# Altium schematic symbol library jlcpcb_2025_04_capacitors_extended_0402.schlib: 3594 symbols (part 18 of 20) (continued)
## RF15N1R5A500CT
designator C?  Capacitance: 1.5pF  (hidden comment: *)
Capacitor, Ceramic (MLCC), 1.5pF, 50V, NP0, SMD 0402; Manufacturer: Walsin Tech Corp; Manufacturer Part Number: RF15N1R5A500CT; Package Size: 0402; JLCPCB Basic Part: No; JLCPCB Part Number: C172850; Supplier 1: LCSC; Category: Capacitors - MLCC; Supplier Part Number 1: C172850; Voltage Rating: 50V; Temperature Coefficient: NP0; RoHS: Yes; ComponentLink1Description: Datasheet; ComponentLink1URL: https://wmsc.lcsc.com/wmsc/upload/file/pdf/v2/lcsc/2304140030_Walsin-Tech-Corp-RF15N1R5A500CT_C172850.pdf; ComponentLink2Description: JLCPCB Part URL; ComponentLink2URL: https://jlcpcb.com/partdetail/C172850; ComponentLink3Description: LCSC Part URL; ComponentLink3URL: https://lcsc.com/product-detail/Multilayer-Ceramic-Capacitors-MLCC---SMD-SMT_Walsin-Tech-Corp-Walsin-Tech-Corp-RF15N1R5A500CT_C172850.html
footprint CAP-0402 (0402 (1005M) Capacitor)
pins: 1, 2

## RF15N1R5B500CT
designator C?  Capacitance: 1.5pF  (hidden comment: *)
Capacitor, Ceramic (MLCC), 1.5pF, 50V, NP0, SMD 0402; Manufacturer: Walsin Tech Corp; Manufacturer Part Number: RF15N1R5B500CT; Package Size: 0402; JLCPCB Basic Part: No; JLCPCB Part Number: C338137; Supplier 1: LCSC; Category: Capacitors - MLCC; Supplier Part Number 1: C338137; Voltage Rating: 50V; Temperature Coefficient: NP0; RoHS: Yes; ComponentLink1Description: Datasheet; ComponentLink1URL: https://wmsc.lcsc.com/wmsc/upload/file/pdf/v2/lcsc/2304140030_Walsin-Tech-Corp-RF15N1R5B500CT_C338137.pdf; ComponentLink2Description: JLCPCB Part URL; ComponentLink2URL: https://jlcpcb.com/partdetail/C338137; ComponentLink3Description: LCSC Part URL; ComponentLink3URL: https://lcsc.com/product-detail/Multilayer-Ceramic-Capacitors-MLCC---SMD-SMT_Walsin-Tech-Corp-Walsin-Tech-Corp-RF15N1R5B500CT_C338137.html
footprint CAP-0402 (0402 (1005M) Capacitor)
pins: 1, 2

## RF15N1R6B500CT
designator C?  Capacitance: 1.6pF  (hidden comment: *)
Capacitor, Ceramic (MLCC), 1.6pF, 50V, NP0, SMD 0402; Manufacturer: Walsin Tech Corp; Manufacturer Part Number: RF15N1R6B500CT; Package Size: 0402; JLCPCB Basic Part: No; JLCPCB Part Number: C384678; Supplier 1: LCSC; Category: Capacitors - MLCC; Supplier Part Number 1: C384678; Voltage Rating: 50V; Temperature Coefficient: NP0; RoHS: Yes; ComponentLink1Description: Datasheet; ComponentLink1URL: https://wmsc.lcsc.com/wmsc/upload/file/pdf/v2/lcsc/2304140030_Walsin-Tech-Corp-RF15N1R6B500CT_C384678.pdf; ComponentLink2Description: JLCPCB Part URL; ComponentLink2URL: https://jlcpcb.com/partdetail/C384678; ComponentLink3Description: LCSC Part URL; ComponentLink3URL: https://lcsc.com/product-detail/Multilayer-Ceramic-Capacitors-MLCC---SMD-SMT_Walsin-Tech-Corp-Walsin-Tech-Corp-RF15N1R6B500CT_C384678.html
footprint CAP-0402 (0402 (1005M) Capacitor)
pins: 1, 2

## RF15N1R8A500CT
designator C?  Capacitance: 1.8pF  (hidden comment: *)
Capacitor, Ceramic (MLCC), 1.8pF, 50V, NP0, SMD 0402; Manufacturer: Walsin Tech Corp; Manufacturer Part Number: RF15N1R8A500CT; Package Size: 0402; JLCPCB Basic Part: No; JLCPCB Part Number: C172859; Supplier 1: LCSC; Category: Capacitors - MLCC; Supplier Part Number 1: C172859; Voltage Rating: 50V; Temperature Coefficient: NP0; RoHS: Yes; ComponentLink1Description: Datasheet; ComponentLink1URL: https://wmsc.lcsc.com/wmsc/upload/file/pdf/v2/lcsc/2304140030_Walsin-Tech-Corp-RF15N1R8A500CT_C172859.pdf; ComponentLink2Description: JLCPCB Part URL; ComponentLink2URL: https://jlcpcb.com/partdetail/C172859; ComponentLink3Description: LCSC Part URL; ComponentLink3URL: https://lcsc.com/product-detail/Multilayer-Ceramic-Capacitors-MLCC---SMD-SMT_Walsin-Tech-Corp-Walsin-Tech-Corp-RF15N1R8A500CT_C172859.html
footprint CAP-0402 (0402 (1005M) Capacitor)
pins: 1, 2

## RF15N1R8B500CT
designator C?  Capacitance: 1.8pF  (hidden comment: *)
Capacitor, Ceramic (MLCC), 1.8pF, 50V, NP0, SMD 0402; Manufacturer: Walsin Tech Corp; Manufacturer Part Number: RF15N1R8B500CT; Package Size: 0402; JLCPCB Basic Part: No; JLCPCB Part Number: C396875; Supplier 1: LCSC; Category: Capacitors - MLCC; Supplier Part Number 1: C396875; Voltage Rating: 50V; Temperature Coefficient: NP0; RoHS: Yes; ComponentLink1Description: Datasheet; ComponentLink1URL: https://wmsc.lcsc.com/wmsc/upload/file/pdf/v2/lcsc/2304140030_Walsin-Tech-Corp-RF15N1R8B500CT_C396875.pdf; ComponentLink2Description: JLCPCB Part URL; ComponentLink2URL: https://jlcpcb.com/partdetail/C396875; ComponentLink3Description: LCSC Part URL; ComponentLink3URL: https://lcsc.com/product-detail/Multilayer-Ceramic-Capacitors-MLCC---SMD-SMT_Walsin-Tech-Corp-Walsin-Tech-Corp-RF15N1R8B500CT_C396875.html
footprint CAP-0402 (0402 (1005M) Capacitor)
pins: 1, 2

## RF15N1R8C500CT
designator C?  Capacitance: 1.8pF  (hidden comment: *)
Capacitor, Ceramic (MLCC), 1.8pF, 50V, NP0, SMD 0402; Manufacturer: Walsin Tech Corp; Manufacturer Part Number: RF15N1R8C500CT; Package Size: 0402; JLCPCB Basic Part: No; JLCPCB Part Number: C172830; Supplier 1: LCSC; Category: Capacitors - MLCC; Supplier Part Number 1: C172830; Voltage Rating: 50V; Temperature Coefficient: NP0; RoHS: Yes; ComponentLink1Description: Datasheet; ComponentLink1URL: https://wmsc.lcsc.com/wmsc/upload/file/pdf/v2/lcsc/2304140030_Walsin-Tech-Corp-RF15N1R8C500CT_C172830.pdf; ComponentLink2Description: JLCPCB Part URL; ComponentLink2URL: https://jlcpcb.com/partdetail/C172830; ComponentLink3Description: LCSC Part URL; ComponentLink3URL: https://lcsc.com/product-detail/Multilayer-Ceramic-Capacitors-MLCC---SMD-SMT_Walsin-Tech-Corp-Walsin-Tech-Corp-RF15N1R8C500CT_C172830.html
footprint CAP-0402 (0402 (1005M) Capacitor)
pins: 1, 2

## RF15N2R0A500CT
designator C?  Capacitance: 2pF  (hidden comment: *)
Capacitor, Ceramic (MLCC), 2pF, 50V, NP0, SMD 0402; Manufacturer: Walsin Tech Corp; Manufacturer Part Number: RF15N2R0A500CT; Package Size: 0402; JLCPCB Basic Part: No; JLCPCB Part Number: C396876; Supplier 1: LCSC; Category: Capacitors - MLCC; Supplier Part Number 1: C396876; Voltage Rating: 50V; Temperature Coefficient: NP0; RoHS: Yes; ComponentLink1Description: Datasheet; ComponentLink1URL: https://wmsc.lcsc.com/wmsc/upload/file/pdf/v2/lcsc/2304140030_Walsin-Tech-Corp-RF15N2R0A500CT_C396876.pdf; ComponentLink2Description: JLCPCB Part URL; ComponentLink2URL: https://jlcpcb.com/partdetail/C396876; ComponentLink3Description: LCSC Part URL; ComponentLink3URL: https://lcsc.com/product-detail/Multilayer-Ceramic-Capacitors-MLCC---SMD-SMT_Walsin-Tech-Corp-Walsin-Tech-Corp-RF15N2R0A500CT_C396876.html
footprint CAP-0402 (0402 (1005M) Capacitor)
pins: 1, 2

## RF15N2R0B500CT
designator C?  Capacitance: 2pF  (hidden comment: *)
Capacitor, Ceramic (MLCC), 2pF, 50V, NP0, SMD 0402; Manufacturer: Walsin Tech Corp; Manufacturer Part Number: RF15N2R0B500CT; Package Size: 0402; JLCPCB Basic Part: No; JLCPCB Part Number: C172829; Supplier 1: LCSC; Category: Capacitors - MLCC; Supplier Part Number 1: C172829; Voltage Rating: 50V; Temperature Coefficient: NP0; RoHS: Yes; ComponentLink1Description: Datasheet; ComponentLink1URL: https://wmsc.lcsc.com/wmsc/upload/file/pdf/v2/lcsc/2304140030_Walsin-Tech-Corp-RF15N2R0B500CT_C172829.pdf; ComponentLink2Description: JLCPCB Part URL; ComponentLink2URL: https://jlcpcb.com/partdetail/C172829; ComponentLink3Description: LCSC Part URL; ComponentLink3URL: https://lcsc.com/product-detail/Multilayer-Ceramic-Capacitors-MLCC---SMD-SMT_Walsin-Tech-Corp-Walsin-Tech-Corp-RF15N2R0B500CT_C172829.html
footprint CAP-0402 (0402 (1005M) Capacitor)
pins: 1, 2

## RF15N2R0C500CT
designator C?  Capacitance: 2pF  (hidden comment: *)
Capacitor, Ceramic (MLCC), 2pF, 50V, NP0, SMD 0402; Manufacturer: Walsin Tech Corp; Manufacturer Part Number: RF15N2R0C500CT; Package Size: 0402; JLCPCB Basic Part: No; JLCPCB Part Number: C396877; Supplier 1: LCSC; Category: Capacitors - MLCC; Supplier Part Number 1: C396877; Voltage Rating: 50V; Temperature Coefficient: NP0; RoHS: Yes; ComponentLink1Description: Datasheet; ComponentLink1URL: https://wmsc.lcsc.com/wmsc/upload/file/pdf/v2/lcsc/2304140030_Walsin-Tech-Corp-RF15N2R0C500CT_C396877.pdf; ComponentLink2Description: JLCPCB Part URL; ComponentLink2URL: https://jlcpcb.com/partdetail/C396877; ComponentLink3Description: LCSC Part URL; ComponentLink3URL: https://lcsc.com/product-detail/Multilayer-Ceramic-Capacitors-MLCC---SMD-SMT_Walsin-Tech-Corp-Walsin-Tech-Corp-RF15N2R0C500CT_C396877.html
footprint CAP-0402 (0402 (1005M) Capacitor)
pins: 1, 2

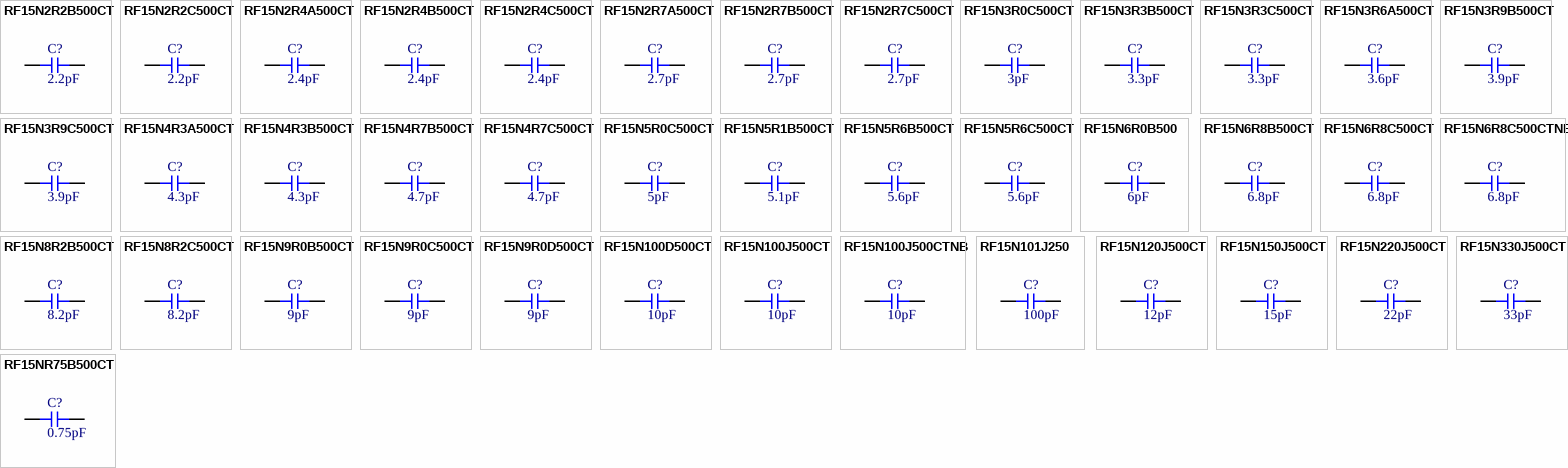
[diagram p80: symbols RF15N2R2B500CT to RF15NR75B500CT]

## RF15N2R2B500CT
designator C?  Capacitance: 2.2pF  (hidden comment: *)
Capacitor, Ceramic (MLCC), 2.2pF, 50V, NP0, SMD 0402; Manufacturer: Walsin Tech Corp; Manufacturer Part Number: RF15N2R2B500CT; Package Size: 0402; JLCPCB Basic Part: No; JLCPCB Part Number: C172819; Supplier 1: LCSC; Category: Capacitors - MLCC; Supplier Part Number 1: C172819; Voltage Rating: 50V; Temperature Coefficient: NP0; RoHS: Yes; ComponentLink1Description: Datasheet; ComponentLink1URL: https://wmsc.lcsc.com/wmsc/upload/file/pdf/v2/lcsc/2304140030_Walsin-Tech-Corp-RF15N2R2B500CT_C172819.pdf; ComponentLink2Description: JLCPCB Part URL; ComponentLink2URL: https://jlcpcb.com/partdetail/C172819; ComponentLink3Description: LCSC Part URL; ComponentLink3URL: https://lcsc.com/product-detail/Multilayer-Ceramic-Capacitors-MLCC---SMD-SMT_Walsin-Tech-Corp-Walsin-Tech-Corp-RF15N2R2B500CT_C172819.html
footprint CAP-0402 (0402 (1005M) Capacitor)
pins: 1, 2

## RF15N2R2C500CT
designator C?  Capacitance: 2.2pF  (hidden comment: *)
Capacitor, Ceramic (MLCC), 2.2pF, 50V, NP0, SMD 0402; Manufacturer: Walsin Tech Corp; Manufacturer Part Number: RF15N2R2C500CT; Package Size: 0402; JLCPCB Basic Part: No; JLCPCB Part Number: C384676; Supplier 1: LCSC; Category: Capacitors - MLCC; Supplier Part Number 1: C384676; Voltage Rating: 50V; Temperature Coefficient: NP0; RoHS: Yes; ComponentLink1Description: Datasheet; ComponentLink1URL: https://wmsc.lcsc.com/wmsc/upload/file/pdf/v2/lcsc/2304140030_Walsin-Tech-Corp-RF15N2R2C500CT_C384676.pdf; ComponentLink2Description: JLCPCB Part URL; ComponentLink2URL: https://jlcpcb.com/partdetail/C384676; ComponentLink3Description: LCSC Part URL; ComponentLink3URL: https://lcsc.com/product-detail/Multilayer-Ceramic-Capacitors-MLCC---SMD-SMT_Walsin-Tech-Corp-Walsin-Tech-Corp-RF15N2R2C500CT_C384676.html
footprint CAP-0402 (0402 (1005M) Capacitor)
pins: 1, 2

## RF15N2R4A500CT
designator C?  Capacitance: 2.4pF  (hidden comment: *)
Capacitor, Ceramic (MLCC), 2.4pF, 50V, NP0, SMD 0402; Manufacturer: Walsin Tech Corp; Manufacturer Part Number: RF15N2R4A500CT; Package Size: 0402; JLCPCB Basic Part: No; JLCPCB Part Number: C396878; Supplier 1: LCSC; Category: Capacitors - MLCC; Supplier Part Number 1: C396878; Voltage Rating: 50V; Temperature Coefficient: NP0; RoHS: Yes; ComponentLink1Description: Datasheet; ComponentLink1URL: https://wmsc.lcsc.com/wmsc/upload/file/pdf/v2/lcsc/2304140030_Walsin-Tech-Corp-RF15N2R4A500CT_C396878.pdf; ComponentLink2Description: JLCPCB Part URL; ComponentLink2URL: https://jlcpcb.com/partdetail/C396878; ComponentLink3Description: LCSC Part URL; ComponentLink3URL: https://lcsc.com/product-detail/Multilayer-Ceramic-Capacitors-MLCC---SMD-SMT_Walsin-Tech-Corp-Walsin-Tech-Corp-RF15N2R4A500CT_C396878.html
footprint CAP-0402 (0402 (1005M) Capacitor)
pins: 1, 2

## RF15N2R4B500CT
designator C?  Capacitance: 2.4pF  (hidden comment: *)
Capacitor, Ceramic (MLCC), 2.4pF, 50V, NP0, SMD 0402; Manufacturer: Walsin Tech Corp; Manufacturer Part Number: RF15N2R4B500CT; Package Size: 0402; JLCPCB Basic Part: No; JLCPCB Part Number: C180256; Supplier 1: LCSC; Category: Capacitors - MLCC; Supplier Part Number 1: C180256; Voltage Rating: 50V; Temperature Coefficient: NP0; RoHS: Yes; ComponentLink1Description: Datasheet; ComponentLink1URL: https://wmsc.lcsc.com/wmsc/upload/file/pdf/v2/lcsc/2304140030_Walsin-Tech-Corp-RF15N2R4B500CT_C180256.pdf; ComponentLink2Description: JLCPCB Part URL; ComponentLink2URL: https://jlcpcb.com/partdetail/C180256; ComponentLink3Description: LCSC Part URL; ComponentLink3URL: https://lcsc.com/product-detail/Multilayer-Ceramic-Capacitors-MLCC---SMD-SMT_Walsin-Tech-Corp-Walsin-Tech-Corp-RF15N2R4B500CT_C180256.html
footprint CAP-0402 (0402 (1005M) Capacitor)
pins: 1, 2

## RF15N2R4C500CT
designator C?  Capacitance: 2.4pF  (hidden comment: *)
Capacitor, Ceramic (MLCC), 2.4pF, 50V, NP0, SMD 0402; Manufacturer: Walsin Tech Corp; Manufacturer Part Number: RF15N2R4C500CT; Package Size: 0402; JLCPCB Basic Part: No; JLCPCB Part Number: C180255; Supplier 1: LCSC; Category: Capacitors - MLCC; Supplier Part Number 1: C180255; Voltage Rating: 50V; Temperature Coefficient: NP0; RoHS: Yes; ComponentLink1Description: Datasheet; ComponentLink1URL: https://wmsc.lcsc.com/wmsc/upload/file/pdf/v2/lcsc/2304140030_Walsin-Tech-Corp-RF15N2R4C500CT_C180255.pdf; ComponentLink2Description: JLCPCB Part URL; ComponentLink2URL: https://jlcpcb.com/partdetail/C180255; ComponentLink3Description: LCSC Part URL; ComponentLink3URL: https://lcsc.com/product-detail/Multilayer-Ceramic-Capacitors-MLCC---SMD-SMT_Walsin-Tech-Corp-Walsin-Tech-Corp-RF15N2R4C500CT_C180255.html
footprint CAP-0402 (0402 (1005M) Capacitor)
pins: 1, 2

## RF15N2R7A500CT
designator C?  Capacitance: 2.7pF  (hidden comment: *)
Capacitor, Ceramic (MLCC), 2.7pF, 50V, NP0, SMD 0402; Manufacturer: Walsin Tech Corp; Manufacturer Part Number: RF15N2R7A500CT; Package Size: 0402; JLCPCB Basic Part: No; JLCPCB Part Number: C172866; Supplier 1: LCSC; Category: Capacitors - MLCC; Supplier Part Number 1: C172866; Voltage Rating: 50V; Temperature Coefficient: NP0; RoHS: Yes; ComponentLink1Description: Datasheet; ComponentLink1URL: https://wmsc.lcsc.com/wmsc/upload/file/pdf/v2/lcsc/2304140030_Walsin-Tech-Corp-RF15N2R7A500CT_C172866.pdf; ComponentLink2Description: JLCPCB Part URL; ComponentLink2URL: https://jlcpcb.com/partdetail/C172866; ComponentLink3Description: LCSC Part URL; ComponentLink3URL: https://lcsc.com/product-detail/Multilayer-Ceramic-Capacitors-MLCC---SMD-SMT_Walsin-Tech-Corp-Walsin-Tech-Corp-RF15N2R7A500CT_C172866.html
footprint CAP-0402 (0402 (1005M) Capacitor)
pins: 1, 2

## RF15N2R7B500CT
designator C?  Capacitance: 2.7pF  (hidden comment: *)
Capacitor, Ceramic (MLCC), 2.7pF, 50V, NP0, SMD 0402; Manufacturer: Walsin Tech Corp; Manufacturer Part Number: RF15N2R7B500CT; Package Size: 0402; JLCPCB Basic Part: No; JLCPCB Part Number: C172831; Supplier 1: LCSC; Category: Capacitors - MLCC; Supplier Part Number 1: C172831; Voltage Rating: 50V; Temperature Coefficient: NP0; RoHS: Yes; ComponentLink1Description: Datasheet; ComponentLink1URL: https://wmsc.lcsc.com/wmsc/upload/file/pdf/v2/lcsc/2304140030_Walsin-Tech-Corp-RF15N2R7B500CT_C172831.pdf; ComponentLink2Description: JLCPCB Part URL; ComponentLink2URL: https://jlcpcb.com/partdetail/C172831; ComponentLink3Description: LCSC Part URL; ComponentLink3URL: https://lcsc.com/product-detail/Multilayer-Ceramic-Capacitors-MLCC---SMD-SMT_Walsin-Tech-Corp-Walsin-Tech-Corp-RF15N2R7B500CT_C172831.html
footprint CAP-0402 (0402 (1005M) Capacitor)
pins: 1, 2

## RF15N2R7C500CT
designator C?  Capacitance: 2.7pF  (hidden comment: *)
Capacitor, Ceramic (MLCC), 2.7pF, 50V, NP0, SMD 0402; Manufacturer: Walsin Tech Corp; Manufacturer Part Number: RF15N2R7C500CT; Package Size: 0402; JLCPCB Basic Part: No; JLCPCB Part Number: C172851; Supplier 1: LCSC; Category: Capacitors - MLCC; Supplier Part Number 1: C172851; Voltage Rating: 50V; Temperature Coefficient: NP0; RoHS: Yes; ComponentLink1Description: Datasheet; ComponentLink1URL: https://wmsc.lcsc.com/wmsc/upload/file/pdf/v2/lcsc/2304140030_Walsin-Tech-Corp-RF15N2R7C500CT_C172851.pdf; ComponentLink2Description: JLCPCB Part URL; ComponentLink2URL: https://jlcpcb.com/partdetail/C172851; ComponentLink3Description: LCSC Part URL; ComponentLink3URL: https://lcsc.com/product-detail/Multilayer-Ceramic-Capacitors-MLCC---SMD-SMT_Walsin-Tech-Corp-Walsin-Tech-Corp-RF15N2R7C500CT_C172851.html
footprint CAP-0402 (0402 (1005M) Capacitor)
pins: 1, 2

## RF15N3R0C500CT
designator C?  Capacitance: 3pF  (hidden comment: *)
Capacitor, Ceramic (MLCC), 3pF, 50V, NP0, SMD 0402; Manufacturer: Walsin Tech Corp; Manufacturer Part Number: RF15N3R0C500CT; Package Size: 0402; JLCPCB Basic Part: No; JLCPCB Part Number: C396879; Supplier 1: LCSC; Category: Capacitors - MLCC; Supplier Part Number 1: C396879; Voltage Rating: 50V; Temperature Coefficient: NP0; RoHS: Yes; ComponentLink1Description: Datasheet; ComponentLink1URL: https://wmsc.lcsc.com/wmsc/upload/file/pdf/v2/lcsc/2304140030_Walsin-Tech-Corp-RF15N3R0C500CT_C396879.pdf; ComponentLink2Description: JLCPCB Part URL; ComponentLink2URL: https://jlcpcb.com/partdetail/C396879; ComponentLink3Description: LCSC Part URL; ComponentLink3URL: https://lcsc.com/product-detail/Multilayer-Ceramic-Capacitors-MLCC---SMD-SMT_Walsin-Tech-Corp-Walsin-Tech-Corp-RF15N3R0C500CT_C396879.html
footprint CAP-0402 (0402 (1005M) Capacitor)
pins: 1, 2

## RF15N3R3B500CT
designator C?  Capacitance: 3.3pF  (hidden comment: *)
Capacitor, Ceramic (MLCC), 3.3pF, 50V, NP0, SMD 0402; Manufacturer: Walsin Tech Corp; Manufacturer Part Number: RF15N3R3B500CT; Package Size: 0402; JLCPCB Basic Part: No; JLCPCB Part Number: C172838; Supplier 1: LCSC; Category: Capacitors - MLCC; Supplier Part Number 1: C172838; Voltage Rating: 50V; Temperature Coefficient: NP0; RoHS: Yes; ComponentLink1Description: Datasheet; ComponentLink1URL: https://wmsc.lcsc.com/wmsc/upload/file/pdf/v2/lcsc/2304140030_Walsin-Tech-Corp-RF15N3R3B500CT_C172838.pdf; ComponentLink2Description: JLCPCB Part URL; ComponentLink2URL: https://jlcpcb.com/partdetail/C172838; ComponentLink3Description: LCSC Part URL; ComponentLink3URL: https://lcsc.com/product-detail/Multilayer-Ceramic-Capacitors-MLCC---SMD-SMT_Walsin-Tech-Corp-Walsin-Tech-Corp-RF15N3R3B500CT_C172838.html
footprint CAP-0402 (0402 (1005M) Capacitor)
pins: 1, 2

## RF15N3R3C500CT
designator C?  Capacitance: 3.3pF  (hidden comment: *)
Capacitor, Ceramic (MLCC), 3.3pF, 50V, NP0, SMD 0402; Manufacturer: Walsin Tech Corp; Manufacturer Part Number: RF15N3R3C500CT; Package Size: 0402; JLCPCB Basic Part: No; JLCPCB Part Number: C172822; Supplier 1: LCSC; Category: Capacitors - MLCC; Supplier Part Number 1: C172822; Voltage Rating: 50V; Temperature Coefficient: NP0; RoHS: Yes; ComponentLink1Description: Datasheet; ComponentLink1URL: https://wmsc.lcsc.com/wmsc/upload/file/pdf/v2/lcsc/2304140030_Walsin-Tech-Corp-RF15N3R3C500CT_C172822.pdf; ComponentLink2Description: JLCPCB Part URL; ComponentLink2URL: https://jlcpcb.com/partdetail/C172822; ComponentLink3Description: LCSC Part URL; ComponentLink3URL: https://lcsc.com/product-detail/Multilayer-Ceramic-Capacitors-MLCC---SMD-SMT_Walsin-Tech-Corp-Walsin-Tech-Corp-RF15N3R3C500CT_C172822.html
footprint CAP-0402 (0402 (1005M) Capacitor)
pins: 1, 2

## RF15N3R6A500CT
designator C?  Capacitance: 3.6pF  (hidden comment: *)
Capacitor, Ceramic (MLCC), 3.6pF, 50V, NP0, SMD 0402; Manufacturer: Walsin Tech Corp; Manufacturer Part Number: RF15N3R6A500CT; Package Size: 0402; JLCPCB Basic Part: No; JLCPCB Part Number: C2918520; Supplier 1: LCSC; Category: Capacitors - MLCC; Supplier Part Number 1: C2918520; Voltage Rating: 50V; Temperature Coefficient: NP0; RoHS: Yes; ComponentLink1Description: Datasheet; ComponentLink1URL: https://wmsc.lcsc.com/wmsc/upload/file/pdf/v2/lcsc/2111171830_Walsin-Tech-Corp-RF15N3R6A500CT_C2918520.pdf; ComponentLink2Description: JLCPCB Part URL; ComponentLink2URL: https://jlcpcb.com/partdetail/C2918520; ComponentLink3Description: LCSC Part URL; ComponentLink3URL: https://lcsc.com/product-detail/Multilayer-Ceramic-Capacitors-MLCC---SMD-SMT_Walsin-Tech-Corp-Walsin-Tech-Corp-RF15N3R6A500CT_C2918520.html
footprint CAP-0402 (0402 (1005M) Capacitor)
pins: 1, 2

## RF15N3R9B500CT
designator C?  Capacitance: 3.9pF  (hidden comment: *)
Capacitor, Ceramic (MLCC), 3.9pF, 50V, NP0, SMD 0402; Manufacturer: Walsin Tech Corp; Manufacturer Part Number: RF15N3R9B500CT; Package Size: 0402; JLCPCB Basic Part: No; JLCPCB Part Number: C304678; Supplier 1: LCSC; Category: Capacitors - MLCC; Supplier Part Number 1: C304678; Voltage Rating: 50V; Temperature Coefficient: NP0; RoHS: Yes; ComponentLink1Description: Datasheet; ComponentLink1URL: https://wmsc.lcsc.com/wmsc/upload/file/pdf/v2/lcsc/2304140030_Walsin-Tech-Corp-RF15N3R9B500CT_C304678.pdf; ComponentLink2Description: JLCPCB Part URL; ComponentLink2URL: https://jlcpcb.com/partdetail/C304678; ComponentLink3Description: LCSC Part URL; ComponentLink3URL: https://lcsc.com/product-detail/Multilayer-Ceramic-Capacitors-MLCC---SMD-SMT_Walsin-Tech-Corp-Walsin-Tech-Corp-RF15N3R9B500CT_C304678.html
footprint CAP-0402 (0402 (1005M) Capacitor)
pins: 1, 2

## RF15N3R9C500CT
designator C?  Capacitance: 3.9pF  (hidden comment: *)
Capacitor, Ceramic (MLCC), 3.9pF, 50V, NP0, SMD 0402; Manufacturer: Walsin Tech Corp; Manufacturer Part Number: RF15N3R9C500CT; Package Size: 0402; JLCPCB Basic Part: No; JLCPCB Part Number: C172816; Supplier 1: LCSC; Category: Capacitors - MLCC; Supplier Part Number 1: C172816; Voltage Rating: 50V; Temperature Coefficient: NP0; RoHS: Yes; ComponentLink1Description: Datasheet; ComponentLink1URL: https://wmsc.lcsc.com/wmsc/upload/file/pdf/v2/lcsc/2304140030_Walsin-Tech-Corp-RF15N3R9C500CT_C172816.pdf; ComponentLink2Description: JLCPCB Part URL; ComponentLink2URL: https://jlcpcb.com/partdetail/C172816; ComponentLink3Description: LCSC Part URL; ComponentLink3URL: https://lcsc.com/product-detail/Multilayer-Ceramic-Capacitors-MLCC---SMD-SMT_Walsin-Tech-Corp-Walsin-Tech-Corp-RF15N3R9C500CT_C172816.html
footprint CAP-0402 (0402 (1005M) Capacitor)
pins: 1, 2

## RF15N4R3A500CT
designator C?  Capacitance: 4.3pF  (hidden comment: *)
Capacitor, Ceramic (MLCC), 4.3pF, 50V, NP0, SMD 0402; Manufacturer: Walsin Tech Corp; Manufacturer Part Number: RF15N4R3A500CT; Package Size: 0402; JLCPCB Basic Part: No; JLCPCB Part Number: C2918589; Supplier 1: LCSC; Category: Capacitors - MLCC; Supplier Part Number 1: C2918589; Voltage Rating: 50V; Temperature Coefficient: NP0; RoHS: Yes; ComponentLink1Description: Datasheet; ComponentLink1URL: https://wmsc.lcsc.com/wmsc/upload/file/pdf/v2/lcsc/2111171830_Walsin-Tech-Corp-RF15N4R3A500CT_C2918589.pdf; ComponentLink2Description: JLCPCB Part URL; ComponentLink2URL: https://jlcpcb.com/partdetail/C2918589; ComponentLink3Description: LCSC Part URL; ComponentLink3URL: https://lcsc.com/product-detail/Multilayer-Ceramic-Capacitors-MLCC---SMD-SMT_Walsin-Tech-Corp-Walsin-Tech-Corp-RF15N4R3A500CT_C2918589.html
footprint CAP-0402 (0402 (1005M) Capacitor)
pins: 1, 2

## RF15N4R3B500CT
designator C?  Capacitance: 4.3pF  (hidden comment: *)
Capacitor, Ceramic (MLCC), 4.3pF, 50V, NP0, SMD 0402; Manufacturer: Walsin Tech Corp; Manufacturer Part Number: RF15N4R3B500CT; Package Size: 0402; JLCPCB Basic Part: No; JLCPCB Part Number: C2909468; Supplier 1: LCSC; Category: Capacitors - MLCC; Supplier Part Number 1: C2909468; Voltage Rating: 50V; Temperature Coefficient: NP0; RoHS: Yes; ComponentLink1Description: Datasheet; ComponentLink1URL: https://wmsc.lcsc.com/wmsc/upload/file/pdf/v2/lcsc/2110281730_Walsin-Tech-Corp-RF15N4R3B500CT_C2909468.pdf; ComponentLink2Description: JLCPCB Part URL; ComponentLink2URL: https://jlcpcb.com/partdetail/C2909468; ComponentLink3Description: LCSC Part URL; ComponentLink3URL: https://lcsc.com/product-detail/Multilayer-Ceramic-Capacitors-MLCC---SMD-SMT_Walsin-Tech-Corp-Walsin-Tech-Corp-RF15N4R3B500CT_C2909468.html
footprint CAP-0402 (0402 (1005M) Capacitor)
pins: 1, 2

## RF15N4R7B500CT
designator C?  Capacitance: 4.7pF  (hidden comment: *)
Capacitor, Ceramic (MLCC), 4.7pF, 50V, NP0, SMD 0402; Manufacturer: Walsin Tech Corp; Manufacturer Part Number: RF15N4R7B500CT; Package Size: 0402; JLCPCB Basic Part: No; JLCPCB Part Number: C172823; Supplier 1: LCSC; Category: Capacitors - MLCC; Supplier Part Number 1: C172823; Voltage Rating: 50V; Temperature Coefficient: NP0; RoHS: Yes; ComponentLink1Description: Datasheet; ComponentLink1URL: https://wmsc.lcsc.com/wmsc/upload/file/pdf/v2/lcsc/2304140030_Walsin-Tech-Corp-RF15N4R7B500CT_C172823.pdf; ComponentLink2Description: JLCPCB Part URL; ComponentLink2URL: https://jlcpcb.com/partdetail/C172823; ComponentLink3Description: LCSC Part URL; ComponentLink3URL: https://lcsc.com/product-detail/Multilayer-Ceramic-Capacitors-MLCC---SMD-SMT_Walsin-Tech-Corp-Walsin-Tech-Corp-RF15N4R7B500CT_C172823.html
footprint CAP-0402 (0402 (1005M) Capacitor)
pins: 1, 2

## RF15N4R7C500CT
designator C?  Capacitance: 4.7pF  (hidden comment: *)
Capacitor, Ceramic (MLCC), 4.7pF, 50V, NP0, SMD 0402; Manufacturer: Walsin Tech Corp; Manufacturer Part Number: RF15N4R7C500CT; Package Size: 0402; JLCPCB Basic Part: No; JLCPCB Part Number: C384675; Supplier 1: LCSC; Category: Capacitors - MLCC; Supplier Part Number 1: C384675; Voltage Rating: 50V; Temperature Coefficient: NP0; RoHS: Yes; ComponentLink1Description: Datasheet; ComponentLink1URL: https://wmsc.lcsc.com/wmsc/upload/file/pdf/v2/lcsc/2304140030_Walsin-Tech-Corp-RF15N4R7C500CT_C384675.pdf; ComponentLink2Description: JLCPCB Part URL; ComponentLink2URL: https://jlcpcb.com/partdetail/C384675; ComponentLink3Description: LCSC Part URL; ComponentLink3URL: https://lcsc.com/product-detail/Multilayer-Ceramic-Capacitors-MLCC---SMD-SMT_Walsin-Tech-Corp-Walsin-Tech-Corp-RF15N4R7C500CT_C384675.html
footprint CAP-0402 (0402 (1005M) Capacitor)
pins: 1, 2

## RF15N5R0C500CT
designator C?  Capacitance: 5pF  (hidden comment: *)
Capacitor, Ceramic (MLCC), 5pF, 50V, NP0, SMD 0402; Manufacturer: Walsin Tech Corp; Manufacturer Part Number: RF15N5R0C500CT; Package Size: 0402; JLCPCB Basic Part: No; JLCPCB Part Number: C384673; Supplier 1: LCSC; Category: Capacitors - MLCC; Supplier Part Number 1: C384673; Voltage Rating: 50V; Temperature Coefficient: NP0; RoHS: Yes; ComponentLink1Description: Datasheet; ComponentLink1URL: https://wmsc.lcsc.com/wmsc/upload/file/pdf/v2/lcsc/2304140030_Walsin-Tech-Corp-RF15N5R0C500CT_C384673.pdf; ComponentLink2Description: JLCPCB Part URL; ComponentLink2URL: https://jlcpcb.com/partdetail/C384673; ComponentLink3Description: LCSC Part URL; ComponentLink3URL: https://lcsc.com/product-detail/Multilayer-Ceramic-Capacitors-MLCC---SMD-SMT_Walsin-Tech-Corp-Walsin-Tech-Corp-RF15N5R0C500CT_C384673.html
footprint CAP-0402 (0402 (1005M) Capacitor)
pins: 1, 2

## RF15N5R1B500CT
designator C?  Capacitance: 5.1pF  (hidden comment: *)
Capacitor, Ceramic (MLCC), 5.1pF, 50V, NP0, SMD 0402; Manufacturer: Walsin Tech Corp; Manufacturer Part Number: RF15N5R1B500CT; Package Size: 0402; JLCPCB Basic Part: No; JLCPCB Part Number: C384672; Supplier 1: LCSC; Category: Capacitors - MLCC; Supplier Part Number 1: C384672; Voltage Rating: 50V; Temperature Coefficient: NP0; RoHS: Yes; ComponentLink1Description: Datasheet; ComponentLink1URL: https://wmsc.lcsc.com/wmsc/upload/file/pdf/v2/lcsc/2304140030_Walsin-Tech-Corp-RF15N5R1B500CT_C384672.pdf; ComponentLink2Description: JLCPCB Part URL; ComponentLink2URL: https://jlcpcb.com/partdetail/C384672; ComponentLink3Description: LCSC Part URL; ComponentLink3URL: https://lcsc.com/product-detail/Multilayer-Ceramic-Capacitors-MLCC---SMD-SMT_Walsin-Tech-Corp-Walsin-Tech-Corp-RF15N5R1B500CT_C384672.html
footprint CAP-0402 (0402 (1005M) Capacitor)
pins: 1, 2

## RF15N5R6B500CT
designator C?  Capacitance: 5.6pF  (hidden comment: *)
Capacitor, Ceramic (MLCC), 5.6pF, 50V, NP0, SMD 0402; Manufacturer: Walsin Tech Corp; Manufacturer Part Number: RF15N5R6B500CT; Package Size: 0402; JLCPCB Basic Part: No; JLCPCB Part Number: C384671; Supplier 1: LCSC; Category: Capacitors - MLCC; Supplier Part Number 1: C384671; Voltage Rating: 50V; Temperature Coefficient: NP0; RoHS: Yes; ComponentLink1Description: Datasheet; ComponentLink1URL: https://wmsc.lcsc.com/wmsc/upload/file/pdf/v2/lcsc/2304140030_Walsin-Tech-Corp-RF15N5R6B500CT_C384671.pdf; ComponentLink2Description: JLCPCB Part URL; ComponentLink2URL: https://jlcpcb.com/partdetail/C384671; ComponentLink3Description: LCSC Part URL; ComponentLink3URL: https://lcsc.com/product-detail/Multilayer-Ceramic-Capacitors-MLCC---SMD-SMT_Walsin-Tech-Corp-Walsin-Tech-Corp-RF15N5R6B500CT_C384671.html
footprint CAP-0402 (0402 (1005M) Capacitor)
pins: 1, 2

## RF15N5R6C500CT
designator C?  Capacitance: 5.6pF  (hidden comment: *)
Capacitor, Ceramic (MLCC), 5.6pF, 50V, NP0, SMD 0402; Manufacturer: Walsin Tech Corp; Manufacturer Part Number: RF15N5R6C500CT; Package Size: 0402; JLCPCB Basic Part: No; JLCPCB Part Number: C396880; Supplier 1: LCSC; Category: Capacitors - MLCC; Supplier Part Number 1: C396880; Voltage Rating: 50V; Temperature Coefficient: NP0; RoHS: Yes; ComponentLink1Description: Datasheet; ComponentLink1URL: https://wmsc.lcsc.com/wmsc/upload/file/pdf/v2/lcsc/2304140030_Walsin-Tech-Corp-RF15N5R6C500CT_C396880.pdf; ComponentLink2Description: JLCPCB Part URL; ComponentLink2URL: https://jlcpcb.com/partdetail/C396880; ComponentLink3Description: LCSC Part URL; ComponentLink3URL: https://lcsc.com/product-detail/Multilayer-Ceramic-Capacitors-MLCC---SMD-SMT_Walsin-Tech-Corp-Walsin-Tech-Corp-RF15N5R6C500CT_C396880.html
footprint CAP-0402 (0402 (1005M) Capacitor)
pins: 1, 2

## RF15N6R0B500
designator C?  Capacitance: 6pF  (hidden comment: *)
Capacitor, Ceramic (MLCC), 6pF, 50V, NP0, SMD 0402; Manufacturer: Walsin Tech Corp; Manufacturer Part Number: RF15N6R0B500; Package Size: 0402; JLCPCB Basic Part: No; JLCPCB Part Number: C180253; Supplier 1: LCSC; Category: Capacitors - MLCC; Supplier Part Number 1: C180253; Voltage Rating: 50V; Temperature Coefficient: NP0; RoHS: Yes; ComponentLink1Description: Datasheet; ComponentLink1URL: https://wmsc.lcsc.com/wmsc/upload/file/pdf/v2/lcsc/2304140030_Walsin-Tech-Corp-RF15N6R0B500_C180253.pdf; ComponentLink2Description: JLCPCB Part URL; ComponentLink2URL: https://jlcpcb.com/partdetail/C180253; ComponentLink3Description: LCSC Part URL; ComponentLink3URL: https://lcsc.com/product-detail/Multilayer-Ceramic-Capacitors-MLCC---SMD-SMT_Walsin-Tech-Corp-Walsin-Tech-Corp-RF15N6R0B500_C180253.html
footprint CAP-0402 (0402 (1005M) Capacitor)
pins: 1, 2

## RF15N6R8B500CT
designator C?  Capacitance: 6.8pF  (hidden comment: *)
Capacitor, Ceramic (MLCC), 6.8pF, 50V, NP0, SMD 0402; Manufacturer: Walsin Tech Corp; Manufacturer Part Number: RF15N6R8B500CT; Package Size: 0402; JLCPCB Basic Part: No; JLCPCB Part Number: C172860; Supplier 1: LCSC; Category: Capacitors - MLCC; Supplier Part Number 1: C172860; Voltage Rating: 50V; Temperature Coefficient: NP0; RoHS: Yes; ComponentLink1Description: Datasheet; ComponentLink1URL: https://wmsc.lcsc.com/wmsc/upload/file/pdf/v2/lcsc/2304140030_Walsin-Tech-Corp-RF15N6R8B500CT_C172860.pdf; ComponentLink2Description: JLCPCB Part URL; ComponentLink2URL: https://jlcpcb.com/partdetail/C172860; ComponentLink3Description: LCSC Part URL; ComponentLink3URL: https://lcsc.com/product-detail/Multilayer-Ceramic-Capacitors-MLCC---SMD-SMT_Walsin-Tech-Corp-Walsin-Tech-Corp-RF15N6R8B500CT_C172860.html
footprint CAP-0402 (0402 (1005M) Capacitor)
pins: 1, 2

## RF15N6R8C500CT
designator C?  Capacitance: 6.8pF  (hidden comment: *)
Capacitor, Ceramic (MLCC), 6.8pF, 50V, NP0, SMD 0402; Manufacturer: Walsin Tech Corp; Manufacturer Part Number: RF15N6R8C500CT; Package Size: 0402; JLCPCB Basic Part: No; JLCPCB Part Number: C172842; Supplier 1: LCSC; Category: Capacitors - MLCC; Supplier Part Number 1: C172842; Voltage Rating: 50V; Temperature Coefficient: NP0; RoHS: Yes; ComponentLink1Description: Datasheet; ComponentLink1URL: https://wmsc.lcsc.com/wmsc/upload/file/pdf/v2/lcsc/2304140030_Walsin-Tech-Corp-RF15N6R8C500CT_C172842.pdf; ComponentLink2Description: JLCPCB Part URL; ComponentLink2URL: https://jlcpcb.com/partdetail/C172842; ComponentLink3Description: LCSC Part URL; ComponentLink3URL: https://lcsc.com/product-detail/Multilayer-Ceramic-Capacitors-MLCC---SMD-SMT_Walsin-Tech-Corp-Walsin-Tech-Corp-RF15N6R8C500CT_C172842.html
footprint CAP-0402 (0402 (1005M) Capacitor)
pins: 1, 2

## RF15N6R8C500CTNB
designator C?  Capacitance: 6.8pF  (hidden comment: *)
Capacitor, Ceramic (MLCC), 6.8pF, 50V, NP0, SMD 0402; Manufacturer: Walsin Tech Corp; Manufacturer Part Number: RF15N6R8C500CTNB; Package Size: 0402; JLCPCB Basic Part: No; JLCPCB Part Number: C396881; Supplier 1: LCSC; Category: Capacitors - MLCC; Supplier Part Number 1: C396881; Voltage Rating: 50V; Temperature Coefficient: NP0; RoHS: Yes; ComponentLink1Description: Datasheet; ComponentLink1URL: https://wmsc.lcsc.com/wmsc/upload/file/pdf/v2/lcsc/2304140030_Walsin-Tech-Corp-RF15N6R8C500CTNB_C396881.pdf; ComponentLink2Description: JLCPCB Part URL; ComponentLink2URL: https://jlcpcb.com/partdetail/C396881; ComponentLink3Description: LCSC Part URL; ComponentLink3URL: https://lcsc.com/product-detail/Multilayer-Ceramic-Capacitors-MLCC---SMD-SMT_Walsin-Tech-Corp-Walsin-Tech-Corp-RF15N6R8C500CTNB_C396881.html
footprint CAP-0402 (0402 (1005M) Capacitor)
pins: 1, 2

## RF15N8R2B500CT
designator C?  Capacitance: 8.2pF  (hidden comment: *)
Capacitor, Ceramic (MLCC), 8.2pF, 50V, NP0, SMD 0402; Manufacturer: Walsin Tech Corp; Manufacturer Part Number: RF15N8R2B500CT; Package Size: 0402; JLCPCB Basic Part: No; JLCPCB Part Number: C172833; Supplier 1: LCSC; Category: Capacitors - MLCC; Supplier Part Number 1: C172833; Voltage Rating: 50V; Temperature Coefficient: NP0; RoHS: Yes; ComponentLink1Description: Datasheet; ComponentLink1URL: https://wmsc.lcsc.com/wmsc/upload/file/pdf/v2/lcsc/2304140030_Walsin-Tech-Corp-RF15N8R2B500CT_C172833.pdf; ComponentLink2Description: JLCPCB Part URL; ComponentLink2URL: https://jlcpcb.com/partdetail/C172833; ComponentLink3Description: LCSC Part URL; ComponentLink3URL: https://lcsc.com/product-detail/Multilayer-Ceramic-Capacitors-MLCC---SMD-SMT_Walsin-Tech-Corp-Walsin-Tech-Corp-RF15N8R2B500CT_C172833.html
footprint CAP-0402 (0402 (1005M) Capacitor)
pins: 1, 2

## RF15N8R2C500CT
designator C?  Capacitance: 8.2pF  (hidden comment: *)
Capacitor, Ceramic (MLCC), 8.2pF, 50V, NP0, SMD 0402; Manufacturer: Walsin Tech Corp; Manufacturer Part Number: RF15N8R2C500CT; Package Size: 0402; JLCPCB Basic Part: No; JLCPCB Part Number: C172835; Supplier 1: LCSC; Category: Capacitors - MLCC; Supplier Part Number 1: C172835; Voltage Rating: 50V; Temperature Coefficient: NP0; RoHS: Yes; ComponentLink1Description: Datasheet; ComponentLink1URL: https://wmsc.lcsc.com/wmsc/upload/file/pdf/v2/lcsc/2304140030_Walsin-Tech-Corp-RF15N8R2C500CT_C172835.pdf; ComponentLink2Description: JLCPCB Part URL; ComponentLink2URL: https://jlcpcb.com/partdetail/C172835; ComponentLink3Description: LCSC Part URL; ComponentLink3URL: https://lcsc.com/product-detail/Multilayer-Ceramic-Capacitors-MLCC---SMD-SMT_Walsin-Tech-Corp-Walsin-Tech-Corp-RF15N8R2C500CT_C172835.html
footprint CAP-0402 (0402 (1005M) Capacitor)
pins: 1, 2

## RF15N9R0B500CT
designator C?  Capacitance: 9pF  (hidden comment: *)
Capacitor, Ceramic (MLCC), 9pF, 50V, NP0, SMD 0402; Manufacturer: Walsin Tech Corp; Manufacturer Part Number: RF15N9R0B500CT; Package Size: 0402; JLCPCB Basic Part: No; JLCPCB Part Number: C384670; Supplier 1: LCSC; Category: Capacitors - MLCC; Supplier Part Number 1: C384670; Voltage Rating: 50V; Temperature Coefficient: NP0; RoHS: Yes; ComponentLink1Description: Datasheet; ComponentLink1URL: https://wmsc.lcsc.com/wmsc/upload/file/pdf/v2/lcsc/2304140030_Walsin-Tech-Corp-RF15N9R0B500CT_C384670.pdf; ComponentLink2Description: JLCPCB Part URL; ComponentLink2URL: https://jlcpcb.com/partdetail/C384670; ComponentLink3Description: LCSC Part URL; ComponentLink3URL: https://lcsc.com/product-detail/Multilayer-Ceramic-Capacitors-MLCC---SMD-SMT_Walsin-Tech-Corp-Walsin-Tech-Corp-RF15N9R0B500CT_C384670.html
footprint CAP-0402 (0402 (1005M) Capacitor)
pins: 1, 2

## RF15N9R0C500CT
designator C?  Capacitance: 9pF  (hidden comment: *)
Capacitor, Ceramic (MLCC), 9pF, 50V, NP0, SMD 0402; Manufacturer: Walsin Tech Corp; Manufacturer Part Number: RF15N9R0C500CT; Package Size: 0402; JLCPCB Basic Part: No; JLCPCB Part Number: C180252; Supplier 1: LCSC; Category: Capacitors - MLCC; Supplier Part Number 1: C180252; Voltage Rating: 50V; Temperature Coefficient: NP0; RoHS: Yes; ComponentLink1Description: Datasheet; ComponentLink1URL: https://wmsc.lcsc.com/wmsc/upload/file/pdf/v2/lcsc/2304140030_Walsin-Tech-Corp-RF15N9R0C500CT_C180252.pdf; ComponentLink2Description: JLCPCB Part URL; ComponentLink2URL: https://jlcpcb.com/partdetail/C180252; ComponentLink3Description: LCSC Part URL; ComponentLink3URL: https://lcsc.com/product-detail/Multilayer-Ceramic-Capacitors-MLCC---SMD-SMT_Walsin-Tech-Corp-Walsin-Tech-Corp-RF15N9R0C500CT_C180252.html
footprint CAP-0402 (0402 (1005M) Capacitor)
pins: 1, 2

## RF15N9R0D500CT
designator C?  Capacitance: 9pF  (hidden comment: *)
Capacitor, Ceramic (MLCC), 9pF, 50V, NP0, SMD 0402; Manufacturer: Walsin Tech Corp; Manufacturer Part Number: RF15N9R0D500CT; Package Size: 0402; JLCPCB Basic Part: No; JLCPCB Part Number: C396882; Supplier 1: LCSC; Category: Capacitors - MLCC; Supplier Part Number 1: C396882; Voltage Rating: 50V; Temperature Coefficient: NP0; RoHS: Yes; ComponentLink1Description: Datasheet; ComponentLink1URL: https://wmsc.lcsc.com/wmsc/upload/file/pdf/v2/lcsc/2304140030_Walsin-Tech-Corp-RF15N9R0D500CT_C396882.pdf; ComponentLink2Description: JLCPCB Part URL; ComponentLink2URL: https://jlcpcb.com/partdetail/C396882; ComponentLink3Description: LCSC Part URL; ComponentLink3URL: https://lcsc.com/product-detail/Multilayer-Ceramic-Capacitors-MLCC---SMD-SMT_Walsin-Tech-Corp-Walsin-Tech-Corp-RF15N9R0D500CT_C396882.html
footprint CAP-0402 (0402 (1005M) Capacitor)
pins: 1, 2

## RF15N100D500CT
designator C?  Capacitance: 10pF  (hidden comment: *)
Capacitor, Ceramic (MLCC), 10pF, 50V, NP0, SMD 0402; Manufacturer: Walsin Tech Corp; Manufacturer Part Number: RF15N100D500CT; Package Size: 0402; JLCPCB Basic Part: No; JLCPCB Part Number: C396871; Supplier 1: LCSC; Category: Capacitors - MLCC; Supplier Part Number 1: C396871; Voltage Rating: 50V; Temperature Coefficient: NP0; RoHS: Yes; ComponentLink1Description: Datasheet; ComponentLink1URL: https://wmsc.lcsc.com/wmsc/upload/file/pdf/v2/lcsc/2304140030_Walsin-Tech-Corp-RF15N100D500CT_C396871.pdf; ComponentLink2Description: JLCPCB Part URL; ComponentLink2URL: https://jlcpcb.com/partdetail/C396871; ComponentLink3Description: LCSC Part URL; ComponentLink3URL: https://lcsc.com/product-detail/Multilayer-Ceramic-Capacitors-MLCC---SMD-SMT_Walsin-Tech-Corp-Walsin-Tech-Corp-RF15N100D500CT_C396871.html
footprint CAP-0402 (0402 (1005M) Capacitor)
pins: 1, 2

## RF15N100J500CT
designator C?  Capacitance: 10pF  (hidden comment: *)
Capacitor, Ceramic (MLCC), 10pF, ±5%, 50V, NP0, ±5%, SMD 0402; Manufacturer: Walsin Tech Corp; Manufacturer Part Number: RF15N100J500CT; Package Size: 0402; JLCPCB Basic Part: No; JLCPCB Part Number: C304676; Supplier 1: LCSC; Category: Capacitors - MLCC; Supplier Part Number 1: C304676; Tolerance: ±5%; Voltage Rating: 50V; Temperature Coefficient: NP0; RoHS: Yes; ComponentLink1Description: Datasheet; ComponentLink1URL: https://wmsc.lcsc.com/wmsc/upload/file/pdf/v2/lcsc/2304140030_Walsin-Tech-Corp-RF15N100J500CT_C304676.pdf; ComponentLink2Description: JLCPCB Part URL; ComponentLink2URL: https://jlcpcb.com/partdetail/C304676; ComponentLink3Description: LCSC Part URL; ComponentLink3URL: https://lcsc.com/product-detail/Multilayer-Ceramic-Capacitors-MLCC---SMD-SMT_Walsin-Tech-Corp-Walsin-Tech-Corp-RF15N100J500CT_C304676.html
footprint CAP-0402 (0402 (1005M) Capacitor)
pins: 1, 2

## RF15N100J500CTNB
designator C?  Capacitance: 10pF  (hidden comment: *)
Capacitor, Ceramic (MLCC), 10pF, ±5%, 50V, NP0, ±5%, SMD 0402; Manufacturer: Walsin Tech Corp; Manufacturer Part Number: RF15N100J500CTNB; Package Size: 0402; JLCPCB Basic Part: No; JLCPCB Part Number: C396872; Supplier 1: LCSC; Category: Capacitors - MLCC; Supplier Part Number 1: C396872; Tolerance: ±5%; Voltage Rating: 50V; Temperature Coefficient: NP0; RoHS: Yes; ComponentLink1Description: Datasheet; ComponentLink1URL: https://wmsc.lcsc.com/wmsc/upload/file/pdf/v2/lcsc/2304140030_Walsin-Tech-Corp-RF15N100J500CTNB_C396872.pdf; ComponentLink2Description: JLCPCB Part URL; ComponentLink2URL: https://jlcpcb.com/partdetail/C396872; ComponentLink3Description: LCSC Part URL; ComponentLink3URL: https://lcsc.com/product-detail/Multilayer-Ceramic-Capacitors-MLCC---SMD-SMT_Walsin-Tech-Corp-Walsin-Tech-Corp-RF15N100J500CTNB_C396872.html
footprint CAP-0402 (0402 (1005M) Capacitor)
pins: 1, 2

## RF15N101J250
designator C?  Capacitance: 100pF  (hidden comment: *)
Capacitor, Ceramic (MLCC), 100pF, ±5%, 25V, NP0, ±5%, SMD 0402; Manufacturer: Walsin Tech Corp; Manufacturer Part Number: RF15N101J250; Package Size: 0402; JLCPCB Basic Part: No; JLCPCB Part Number: C180260; Supplier 1: LCSC; Category: Capacitors - MLCC; Supplier Part Number 1: C180260; Tolerance: ±5%; Voltage Rating: 25V; Temperature Coefficient: NP0; RoHS: Yes; ComponentLink1Description: Datasheet; ComponentLink1URL: https://wmsc.lcsc.com/wmsc/upload/file/pdf/v2/lcsc/2304140030_Walsin-Tech-Corp-RF15N101J250_C180260.pdf; ComponentLink2Description: JLCPCB Part URL; ComponentLink2URL: https://jlcpcb.com/partdetail/C180260; ComponentLink3Description: LCSC Part URL; ComponentLink3URL: https://lcsc.com/product-detail/Multilayer-Ceramic-Capacitors-MLCC---SMD-SMT_Walsin-Tech-Corp-Walsin-Tech-Corp-RF15N101J250_C180260.html
footprint CAP-0402 (0402 (1005M) Capacitor)
pins: 1, 2

## RF15N120J500CT
designator C?  Capacitance: 12pF  (hidden comment: *)
Capacitor, Ceramic (MLCC), 12pF, ±5%, 50V, NP0, ±5%, SMD 0402; Manufacturer: Walsin Tech Corp; Manufacturer Part Number: RF15N120J500CT; Package Size: 0402; JLCPCB Basic Part: No; JLCPCB Part Number: C172821; Supplier 1: LCSC; Category: Capacitors - MLCC; Supplier Part Number 1: C172821; Tolerance: ±5%; Voltage Rating: 50V; Temperature Coefficient: NP0; RoHS: Yes; ComponentLink1Description: Datasheet; ComponentLink1URL: https://wmsc.lcsc.com/wmsc/upload/file/pdf/v2/lcsc/2304140030_Walsin-Tech-Corp-RF15N120J500CT_C172821.pdf; ComponentLink2Description: JLCPCB Part URL; ComponentLink2URL: https://jlcpcb.com/partdetail/C172821; ComponentLink3Description: LCSC Part URL; ComponentLink3URL: https://lcsc.com/product-detail/Multilayer-Ceramic-Capacitors-MLCC---SMD-SMT_Walsin-Tech-Corp-Walsin-Tech-Corp-RF15N120J500CT_C172821.html
footprint CAP-0402 (0402 (1005M) Capacitor)
pins: 1, 2

## RF15N150J500CT
designator C?  Capacitance: 15pF  (hidden comment: *)
Capacitor, Ceramic (MLCC), 15pF, ±5%, 50V, NP0, ±5%, SMD 0402; Manufacturer: Walsin Tech Corp; Manufacturer Part Number: RF15N150J500CT; Package Size: 0402; JLCPCB Basic Part: No; JLCPCB Part Number: C384680; Supplier 1: LCSC; Category: Capacitors - MLCC; Supplier Part Number 1: C384680; Tolerance: ±5%; Voltage Rating: 50V; Temperature Coefficient: NP0; RoHS: Yes; ComponentLink1Description: Datasheet; ComponentLink1URL: https://wmsc.lcsc.com/wmsc/upload/file/pdf/v2/lcsc/2304140030_Walsin-Tech-Corp-RF15N150J500CT_C384680.pdf; ComponentLink2Description: JLCPCB Part URL; ComponentLink2URL: https://jlcpcb.com/partdetail/C384680; ComponentLink3Description: LCSC Part URL; ComponentLink3URL: https://lcsc.com/product-detail/Multilayer-Ceramic-Capacitors-MLCC---SMD-SMT_Walsin-Tech-Corp-Walsin-Tech-Corp-RF15N150J500CT_C384680.html
footprint CAP-0402 (0402 (1005M) Capacitor)
pins: 1, 2

## RF15N220J500CT
designator C?  Capacitance: 22pF  (hidden comment: *)
Capacitor, Ceramic (MLCC), 22pF, ±5%, 50V, NP0, ±5%, SMD 0402; Manufacturer: Walsin Tech Corp; Manufacturer Part Number: RF15N220J500CT; Package Size: 0402; JLCPCB Basic Part: No; JLCPCB Part Number: C384677; Supplier 1: LCSC; Category: Capacitors - MLCC; Supplier Part Number 1: C384677; Tolerance: ±5%; Voltage Rating: 50V; Temperature Coefficient: NP0; RoHS: Yes; ComponentLink1Description: Datasheet; ComponentLink1URL: https://wmsc.lcsc.com/wmsc/upload/file/pdf/v2/lcsc/2304140030_Walsin-Tech-Corp-RF15N220J500CT_C384677.pdf; ComponentLink2Description: JLCPCB Part URL; ComponentLink2URL: https://jlcpcb.com/partdetail/C384677; ComponentLink3Description: LCSC Part URL; ComponentLink3URL: https://lcsc.com/product-detail/Multilayer-Ceramic-Capacitors-MLCC---SMD-SMT_Walsin-Tech-Corp-Walsin-Tech-Corp-RF15N220J500CT_C384677.html
footprint CAP-0402 (0402 (1005M) Capacitor)
pins: 1, 2

## RF15N330J500CT
designator C?  Capacitance: 33pF  (hidden comment: *)
Capacitor, Ceramic (MLCC), 33pF, ±5%, 50V, NP0, ±5%, SMD 0402; Manufacturer: Walsin Tech Corp; Manufacturer Part Number: RF15N330J500CT; Package Size: 0402; JLCPCB Basic Part: No; JLCPCB Part Number: C2909450; Supplier 1: LCSC; Category: Capacitors - MLCC; Supplier Part Number 1: C2909450; Tolerance: ±5%; Voltage Rating: 50V; Temperature Coefficient: NP0; RoHS: Yes; ComponentLink1Description: Datasheet; ComponentLink1URL: https://wmsc.lcsc.com/wmsc/upload/file/pdf/v2/lcsc/2110281730_Walsin-Tech-Corp-RF15N330J500CT_C2909450.pdf; ComponentLink2Description: JLCPCB Part URL; ComponentLink2URL: https://jlcpcb.com/partdetail/C2909450; ComponentLink3Description: LCSC Part URL; ComponentLink3URL: https://lcsc.com/product-detail/Multilayer-Ceramic-Capacitors-MLCC---SMD-SMT_Walsin-Tech-Corp-Walsin-Tech-Corp-RF15N330J500CT_C2909450.html
footprint CAP-0402 (0402 (1005M) Capacitor)
pins: 1, 2

## RF15NR75B500CT
designator C?  Capacitance: 0.75pF  (hidden comment: *)
Capacitor, Ceramic (MLCC), 0.75pF, 50V, NP0, SMD 0402; Manufacturer: Walsin Tech Corp; Manufacturer Part Number: RF15NR75B500CT; Package Size: 0402; JLCPCB Basic Part: No; JLCPCB Part Number: C384669; Supplier 1: LCSC; Category: Capacitors - MLCC; Supplier Part Number 1: C384669; Voltage Rating: 50V; Temperature Coefficient: NP0; RoHS: Yes; ComponentLink1Description: Datasheet; ComponentLink1URL: https://wmsc.lcsc.com/wmsc/upload/file/pdf/v2/lcsc/2304140030_Walsin-Tech-Corp-RF15NR75B500CT_C384669.pdf; ComponentLink2Description: JLCPCB Part URL; ComponentLink2URL: https://jlcpcb.com/partdetail/C384669; ComponentLink3Description: LCSC Part URL; ComponentLink3URL: https://lcsc.com/product-detail/Multilayer-Ceramic-Capacitors-MLCC---SMD-SMT_Walsin-Tech-Corp-Walsin-Tech-Corp-RF15NR75B500CT_C384669.html
footprint CAP-0402 (0402 (1005M) Capacitor)
pins: 1, 2
